# Altium integrated library GPDSE.IntLib: 634 symbols (part 1 of 7) (continued)
## UF4007 (continued)
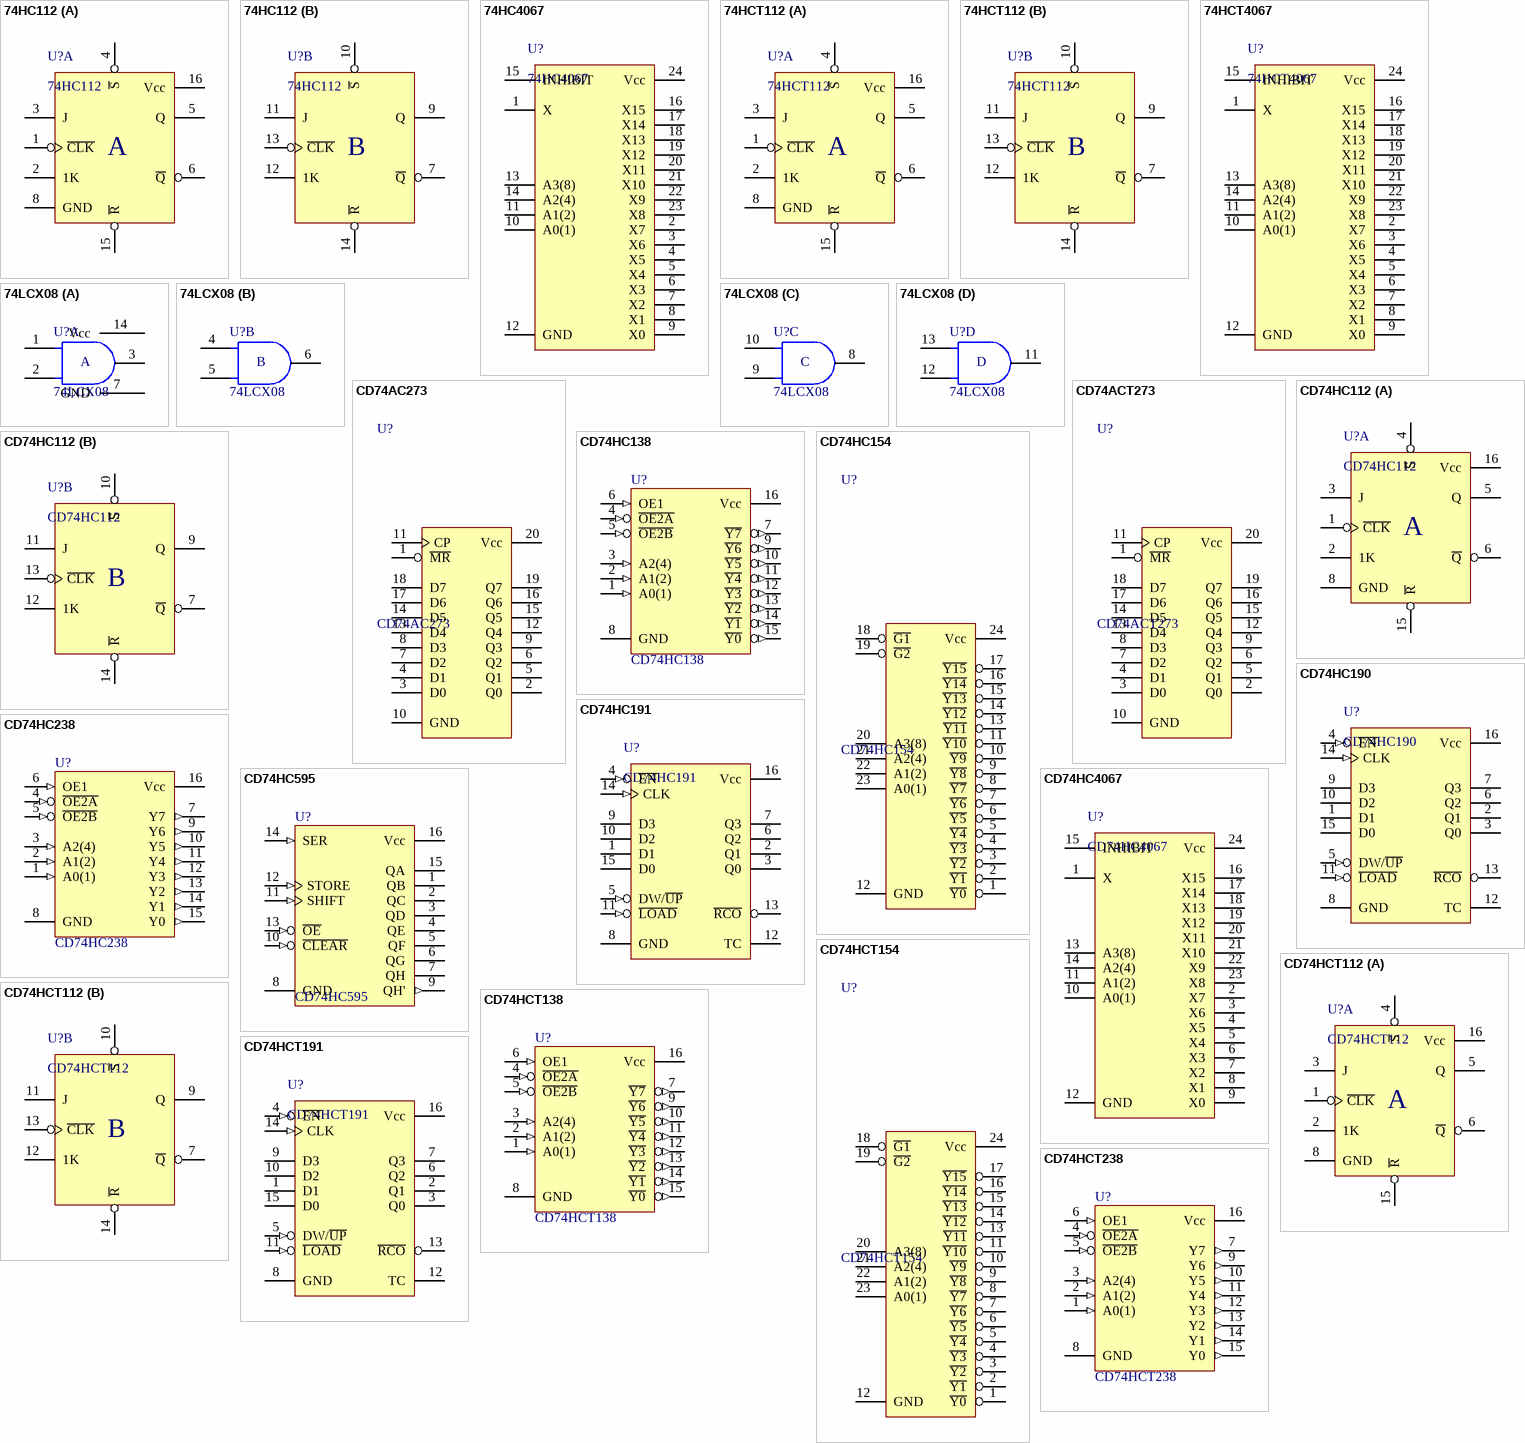
[diagram p2: symbols 74HC112 to CD74HCT238]

## 74HC112
designator U?
[NXP] Dual JK Negative Edge Triggered Flip-Flop with Set and Reset; Input Voltage (Vi): 0 to Vcc; Output High Current (Ioh): +25 mA; Output Low Current (Iol): -25 mA; Propagation Delay High-Low (tphl): 17ns; Supply Voltage (Vcc): 2.0 to 6.0 V; Output Voltage (Vo): 0 to Vcc; Propagation Delay Low-High (tplh): 17ns
footprint SOIC16-150(50) (SOIC 16 Leads; Row Spacing 3.81 mm; Pitch 1.27 mm; 3D André L´Hérault)
footprint SOP16-4.4mm(0.65mm) (Thin Shrink Small Outline Package 16 pin)
footprint SOP16-5.3mm(0.65mm) (Small Outline Package 16 pin)
part A pins: 1 ~{CLK}, 2 1K, 3 J, 4 ~{S}, 5 Q, 6 ~{Q}, 8 GND (power), 15 ~{R}, 16 Vcc (power)
part B pins: 7 ~{Q}, 9 Q, 10 ~{S}, 11 J, 12 1K, 13 ~{CLK}, 14 ~{R}
part A text: A
part B text: B

## 74HC4067
designator U?
[NXP] 16-Channel Analog Multiplexer / Demultiplexer
footprint SOIC24-300(50) (SOIC 24 Leads; Row Spacing 7.62 mm; Pitch 1.27 mm; 3D André L´Hérault)
footprint SOP24-5.3mm(0.65mm) (Footprint not found)
footprint SOP24-4.4mm(0.65mm) (Footprint not found)
pins: 1 X, 2 X7, 3 X6, 4 X5, 5 X4, 6 X3, 7 X2, 8 X1, 9 X0, 10 A0(1), 11 A1(2), 12 GND, 13 A3(8), 14 A2(4), 15 INHIBIT, 16 X15, 17 X14, 18 X13, 19 X12, 20 X11, 21 X10, 22 X9, 23 X8, 24 Vcc

## 74HCT112
designator U?
[NXP] Dual JK Negative Edge Triggered Flip-Flop with Set and Reset; Input Voltage (Vi): 0 to Vcc; Output High Current (Ioh): +25 mA; Output Low Current (Iol): -25 mA; Propagation Delay High-Low (tphl): 17ns; Supply Voltage (Vcc): 4.5 to 5.5 V; Output Voltage (Vo): 0 to Vcc; Propagation Delay Low-High (tplh): 17ns
footprint SOIC16-150(50) (SOIC 16 Leads; Row Spacing 3.81 mm; Pitch 1.27 mm; 3D André L´Hérault)
footprint SOP16-4.4mm(0.65mm) (Thin Shrink Small Outline Package 16 pin)
footprint SOP16-5.3mm(0.65mm) (Small Outline Package 16 pin)
part A pins: 1 ~{CLK}, 2 1K, 3 J, 4 ~{S}, 5 Q, 6 ~{Q}, 8 GND (power), 15 ~{R}, 16 Vcc (power)
part B pins: 7 ~{Q}, 9 Q, 10 ~{S}, 11 J, 12 1K, 13 ~{CLK}, 14 ~{R}
part A text: A
part B text: B

## 74HCT4067
designator U?
[NXP] 16-Channel Analog Multiplexer / Demultiplexer
footprint SOIC24-300(50) (SOIC 24 Leads; Row Spacing 7.62 mm; Pitch 1.27 mm; 3D André L´Hérault)
footprint SOP24-5.3mm(0.65mm) (Footprint not found)
footprint SOP24-4.4mm(0.65mm) (Footprint not found)
pins: 1 X, 2 X7, 3 X6, 4 X5, 5 X4, 6 X3, 7 X2, 8 X1, 9 X0, 10 A0(1), 11 A1(2), 12 GND, 13 A3(8), 14 A2(4), 15 INHIBIT, 16 X15, 17 X14, 18 X13, 19 X12, 20 X11, 21 X10, 22 X9, 23 X8, 24 Vcc

## 74LCX08
designator U?
[FAIR] Low Voltage Quad 2-Input AND Gate with 5V Tolerant Inputs; Supply Voltage (Vcc): 2.0 to 3.6 V; Input Voltage (Vi): 0 to 5.5 V; Output Voltage (Vo): 0 to Vcc; Output High Current (Ioh): -24 mA; Output Low Current (Iol): 24 mA; Propagation Delay High-Low (tphl): 5.5ns; Propagation Delay Low-High (tplh): 5.5ns
footprint SOIC14-150(50) (Plastic Small Outline 14 pinos)
footprint SOP14-5.3mm(1.27mm) (Small Outline Package 14 pin)
footprint SOP14-4.4mm(0.65mm) (Thin Shrink Small Outline Package 14 pin)
part A pins: 1 A0, 2 B0, 3 Y0, 7 GND, 14 Vcc
part B pins: 4 A1, 5 B1, 6 Y1
part C pins: 8 Y2, 9 B2, 10 A2
part D pins: 11 Y3, 12 B3, 13 A3
part A text: A
part B text: B
part C text: C
part D text: D

## CD74AC273
designator U?
[TI] Octal D Flip-Flop with Reset
footprint DIP20-300(100) (Footprint not found)
footprint SOIC20-300(50) (Plastic Small Outline 20 pinos largo)
pins: 1 ~{MR}, 2 Q0, 3 D0, 4 D1, 5 Q1, 6 Q2, 7 D2, 8 D3, 9 Q3, 10 GND, 11 CP, 12 Q4, 13 D4, 14 D5, 15 Q5, 16 Q6, 17 D6, 18 D7, 19 Q7, 20 Vcc

## CD74ACT273
designator U?
[TI] Octal D Flip-Flop with Reset
footprint DIP20-300(100) (Footprint not found)
footprint SOIC20-300(50) (Plastic Small Outline 20 pinos largo)
footprint SOP20-4.4mm(0.65mm) (Footprint not found)
footprint SOP20-5.3mm(0.65mm) (Footprint not found)
pins: 1 ~{MR}, 2 Q0, 3 D0, 4 D1, 5 Q1, 6 Q2, 7 D2, 8 D3, 9 Q3, 10 GND, 11 CP, 12 Q4, 13 D4, 14 D5, 15 Q5, 16 Q6, 17 D6, 18 D7, 19 Q7, 20 Vcc

## CD74HC112
designator U?
[TI] Dual JK Negative Edge Triggered Flip-Flop with Set and Reset; Input Voltage (Vi): 0 to Vcc; Output High Current (Ioh): +25 mA; Output Low Current (Iol): -25 mA; Propagation Delay High-Low (tphl): 17ns; Supply Voltage (Vcc): 2.0 to 6.0 V; Output Voltage (Vo): 0 to Vcc; Propagation Delay Low-High (tplh): 17ns
footprint SOIC16-150(50) (SOIC 16 Leads; Row Spacing 3.81 mm; Pitch 1.27 mm; 3D André L´Hérault)
footprint SOP16-4.4mm(0.65mm) (Thin Shrink Small Outline Package 16 pin)
footprint SOP16-5.3mm(1.27mm) (Small Outline Package 16 pin)
footprint DIP16-300(100) (DIP, 16-Leads, Row Spacing 7.62mm, Pitch 2.54mm, Body 22.86x6.35mm)
part A pins: 1 ~{CLK}, 2 1K, 3 J, 4 ~{S}, 5 Q, 6 ~{Q}, 8 GND (power), 15 ~{R}, 16 Vcc (power)
part B pins: 7 ~{Q}, 9 Q, 10 ~{S}, 11 J, 12 1K, 13 ~{CLK}, 14 ~{R}
part A text: A
part B text: B

## CD74HC138
designator U?
[TI] High Speed CMOS Logic 3-Line to 8-Line Decoder / Demultiplexer Inverting; Supply Voltage (Vcc): 2.0 to 6.0 V; Input Voltage (Vi): 0 to Vcc; Propagation Delay High-Low (tphl): 13ns; Output High Current (Ioh): -25 mA; Output Low Current (Iol): 25 mA; Output Voltage (Vo): 0 to Vcc; Propagation Delay Low-High (tplh): 13ns
footprint SOIC16-150(50) (SOIC; 16 Leads; Row Spacing 3.81 mm; Pitch 1.27 mm; 3D Antonio Fagaldo)
footprint DIP16-300(100) (DIP, 16-Leads, Row Spacing 7.62mm, Pitch 2.54mm, Body 22.86x6.35mm)
pins: 1 A0(1) (in), 2 A1(2) (in), 3 A2(4) (in), 4 ~{OE2A} (in), 5 ~{OE2B} (in), 6 OE1 (in), 7 ~{Y7} (out), 8 GND (power), 9 ~{Y6} (out), 10 ~{Y5} (out), 11 ~{Y4} (out), 12 ~{Y3} (out), 13 ~{Y2} (out), 14 ~{Y1} (out), 15 ~{Y0} (out), 16 Vcc (power)

## CD74HC154
designator U?
[TI] 4-Line to 16-Line Decoder / Demultiplexer
footprint SOIC24-300(50) (Plastic Small Outline 24 pinos largo)
pins: 1 ~{Y0}, 2 ~{Y1}, 3 ~{Y2}, 4 ~{Y3}, 5 ~{Y4}, 6 ~{Y5}, 7 ~{Y6}, 8 ~{Y7}, 9 ~{Y8}, 10 ~{Y9}, 11 ~{Y10}, 12 GND, 13 ~{Y11}, 14 ~{Y12}, 15 ~{Y13}, 16 ~{Y14}, 17 ~{Y15}, 18 ~{G1}, 19 ~{G2}, 20 A3(8), 21 A2(4), 22 A1(2), 23 A0(1), 24 Vcc

## CD74HC190
designator U?
[TI] Synchronous Up/Down BCD Decade Counter with Down/Up Mode Control
footprint DIP16-300(100) (DIP, 16-Leads, Row Spacing 7.62mm, Pitch 2.54mm, Body 22.86x6.35mm)
footprint SOP16-5.3mm(1.27mm) (Small Outline Package 16 pin)
footprint SOP16-4.4mm(0.65mm) (Thin Shrink Small Outline Package 16 pin)
pins: 1 D1, 2 Q1, 3 Q0, 4 ~{EN} (in), 5 DW/~{UP} (in), 6 Q2, 7 Q3, 8 GND, 9 D3, 10 D2, 11 ~{LOAD} (in), 12 TC, 13 ~{RCO}, 14 CLK (in), 15 D0, 16 Vcc

## CD74HC191
designator U?
[TI] Synchronous Up/Down 4-Bits Counter with Down/Up Mode Control
footprint DIP16-300(100) (DIP; 16 Leads; Row Spacing 7.62 mm; Pitch 2.54 mm; 3D CircuitWorks)
footprint SOIC16-150(50) (SOIC 16 Leads; Row Spacing 3.81 mm; Pitch 1.27 mm; 3D André L´Hérault)
pins: 1 D1, 2 Q1, 3 Q0, 4 ~{EN} (in), 5 DW/~{UP} (in), 6 Q2, 7 Q3, 8 GND, 9 D3, 10 D2, 11 ~{LOAD} (in), 12 TC, 13 ~{RCO}, 14 CLK (in), 15 D0, 16 Vcc

## CD74HC238
designator U?
[TI] High Speed CMOS Logic 3-Line to 8-Line Decoder / Demultiplexer Noninverting; Supply Voltage (Vcc): 2.0 to 6.0 V; Input Voltage (Vi): 0 to Vcc; Propagation Delay High-Low (tphl): 13ns; Output High Current (Ioh): -25 mA; Output Low Current (Iol): 25 mA; Output Voltage (Vo): 0 to Vcc; Propagation Delay Low-High (tplh): 13ns
footprint SOIC16-150(50) (SOIC; 16 Leads; Row Spacing 3.81 mm; Pitch 1.27 mm; 3D Antonio Fagaldo)
footprint DIP16-300(100) (DIP; 16 Leads; Row Spacing 7.62 mm; Pitch 2.54 mm; 3D CircuitWorks)
footprint SOP16-4.4mm(0.65mm) (Footprint not found)
footprint SOP16-5.3mm(1.27mm) (Small Outline Package 16 pin)
pins: 1 A0(1) (in), 2 A1(2) (in), 3 A2(4) (in), 4 ~{OE2A} (in), 5 ~{OE2B} (in), 6 OE1 (in), 7 Y7 (out), 8 GND (power), 9 Y6 (out), 10 Y5 (out), 11 Y4 (out), 12 Y3 (out), 13 Y2 (out), 14 Y1 (out), 15 Y0 (out), 16 Vcc (power)

## CD74HC595
designator U?
[TI] 8-Bit Shift Register with 3-State Output Registers; Supply Voltage (Vcc): 2.0 to 6.0 V; Input Voltage (Vi): 0 to Vcc; Output High Current (Ioh): -6 mA; Output Low Current (Iol): 6 mA; Clock Frequency (fclock): 31 MHz; Output Voltage (Vo): 0 to Vcc
footprint SOIC16-150(50) (SOIC; 16 Leads; Row Spacing 3.81 mm; Pitch 1.27 mm; 3D Antonio Fagaldo)
footprint DIP16-300(100) (DIP, 16-Leads, Row Spacing 7.62mm, Pitch 2.54mm, Body 22.86x6.35mm)
footprint SOP16-5.3mm(0.65mm) (Footprint not found)
footprint SOIC16-300(50) (Footprint not found)
footprint SOP16-5.3mm(1.27mm) (Footprint not found)
pins: 1 QB (hiz), 2 QC (hiz), 3 QD (hiz), 4 QE (hiz), 5 QF (hiz), 6 QG (hiz), 7 QH (hiz), 8 GND (power), 9 QH' (out), 10 ~{CLEAR} (in), 11 SHIFT (in), 12 STORE (in), 13 ~{OE} (in), 14 SER (in), 15 QA (hiz), 16 Vcc (power)

## CD74HC4067
designator U?
[TI] 16-Channel Analog Multiplexer / Demultiplexer
footprint SOIC24-300(50) (SOIC 24 Leads; Row Spacing 7.62 mm; Pitch 1.27 mm; 3D André L´Hérault)
footprint SOP24-5.3mm(0.65mm) (Footprint not found)
pins: 1 X, 2 X7, 3 X6, 4 X5, 5 X4, 6 X3, 7 X2, 8 X1, 9 X0, 10 A0(1), 11 A1(2), 12 GND, 13 A3(8), 14 A2(4), 15 INHIBIT, 16 X15, 17 X14, 18 X13, 19 X12, 20 X11, 21 X10, 22 X9, 23 X8, 24 Vcc

## CD74HCT112
designator U?
[TI] Dual JK Negative Edge Triggered Flip-Flop with Set and Reset; Input Voltage (Vi): 0 to Vcc; Output High Current (Ioh): +25 mA; Output Low Current (Iol): -25 mA; Propagation Delay High-Low (tphl): 17ns; Supply Voltage (Vcc): 4.5 to 5.5 V; Output Voltage (Vo): 0 to Vcc; Propagation Delay Low-High (tplh): 17ns
footprint DIP16-300(100) (DIP, 16-Leads, Row Spacing 7.62mm, Pitch 2.54mm, Body 22.86x6.35mm)
part A pins: 1 ~{CLK}, 2 1K, 3 J, 4 ~{S}, 5 Q, 6 ~{Q}, 8 GND (power), 15 ~{R}, 16 Vcc (power)
part B pins: 7 ~{Q}, 9 Q, 10 ~{S}, 11 J, 12 1K, 13 ~{CLK}, 14 ~{R}
part A text: A
part B text: B

## CD74HCT138
designator U?
[TI] High Speed CMOS Logic 3-Line to 8-Line Decoder / Demultiplexer Inverting; Supply Voltage (Vcc): 4.5 to 5.5 V; Input Voltage (Vi): 0 to Vcc; Propagation Delay High-Low (tphl): 14ns; Output High Current (Ioh): -25 mA; Output Low Current (Iol): 25 mA; Output Voltage (Vo): 0 to Vcc; Propagation Delay Low-High (tplh): 14ns
footprint SOIC16-150(50) (SOIC; 16 Leads; Row Spacing 3.81 mm; Pitch 1.27 mm; 3D Antonio Fagaldo)
footprint DIP16-300(100) (DIP; 16 Leads; Row Spacing 7.62 mm; Pitch 2.54 mm; 3D CircuitWorks)
pins: 1 A0(1) (in), 2 A1(2) (in), 3 A2(4) (in), 4 ~{OE2A} (in), 5 ~{OE2B} (in), 6 OE1 (in), 7 ~{Y7} (out), 8 GND (power), 9 ~{Y6} (out), 10 ~{Y5} (out), 11 ~{Y4} (out), 12 ~{Y3} (out), 13 ~{Y2} (out), 14 ~{Y1} (out), 15 ~{Y0} (out), 16 Vcc (power)

## CD74HCT154
designator U?
[TI] 4-Line to 16-Line Decoder / Demultiplexer
footprint SOIC24-300(50) (Plastic Small Outline 24 pinos largo)
pins: 1 ~{Y0}, 2 ~{Y1}, 3 ~{Y2}, 4 ~{Y3}, 5 ~{Y4}, 6 ~{Y5}, 7 ~{Y6}, 8 ~{Y7}, 9 ~{Y8}, 10 ~{Y9}, 11 ~{Y10}, 12 GND, 13 ~{Y11}, 14 ~{Y12}, 15 ~{Y13}, 16 ~{Y14}, 17 ~{Y15}, 18 ~{G1}, 19 ~{G2}, 20 A3(8), 21 A2(4), 22 A1(2), 23 A0(1), 24 Vcc

## CD74HCT191
designator U?
[TI] Synchronous Up/Down 4-Bits Counter with Down/Up Mode Control
footprint DIP16-300(100) (DIP; 16 Leads; Row Spacing 7.62 mm; Pitch 2.54 mm; 3D CircuitWorks)
footprint SOIC16-150(50) (SOIC 16 Leads; Row Spacing 3.81 mm; Pitch 1.27 mm; 3D André L´Hérault)
pins: 1 D1, 2 Q1, 3 Q0, 4 ~{EN} (in), 5 DW/~{UP} (in), 6 Q2, 7 Q3, 8 GND, 9 D3, 10 D2, 11 ~{LOAD} (in), 12 TC, 13 ~{RCO}, 14 CLK (in), 15 D0, 16 Vcc

## CD74HCT238
designator U?
[TI] High Speed CMOS Logic 3-Line to 8-Line Decoder / Demultiplexer Noninverting; Supply Voltage (Vcc): 4.5 to 5.5 V; Input Voltage (Vi): 0 to Vcc; Propagation Delay High-Low (tphl): 14ns; Output High Current (Ioh): -25 mA; Output Low Current (Iol): 25 mA; Output Voltage (Vo): 0 to Vcc; Propagation Delay Low-High (tplh): 14ns
footprint SOIC16-150(50) (SOIC; 16 Leads; Row Spacing 3.81 mm; Pitch 1.27 mm; 3D Antonio Fagaldo)
footprint DIP16-300(100) (DIP; 16 Leads; Row Spacing 7.62 mm; Pitch 2.54 mm; 3D CircuitWorks)
pins: 1 A0(1) (in), 2 A1(2) (in), 3 A2(4) (in), 4 ~{OE2A} (in), 5 ~{OE2B} (in), 6 OE1 (in), 7 Y7 (out), 8 GND (power), 9 Y6 (out), 10 Y5 (out), 11 Y4 (out), 12 Y3 (out), 13 Y2 (out), 14 Y1 (out), 15 Y0 (out), 16 Vcc (power)

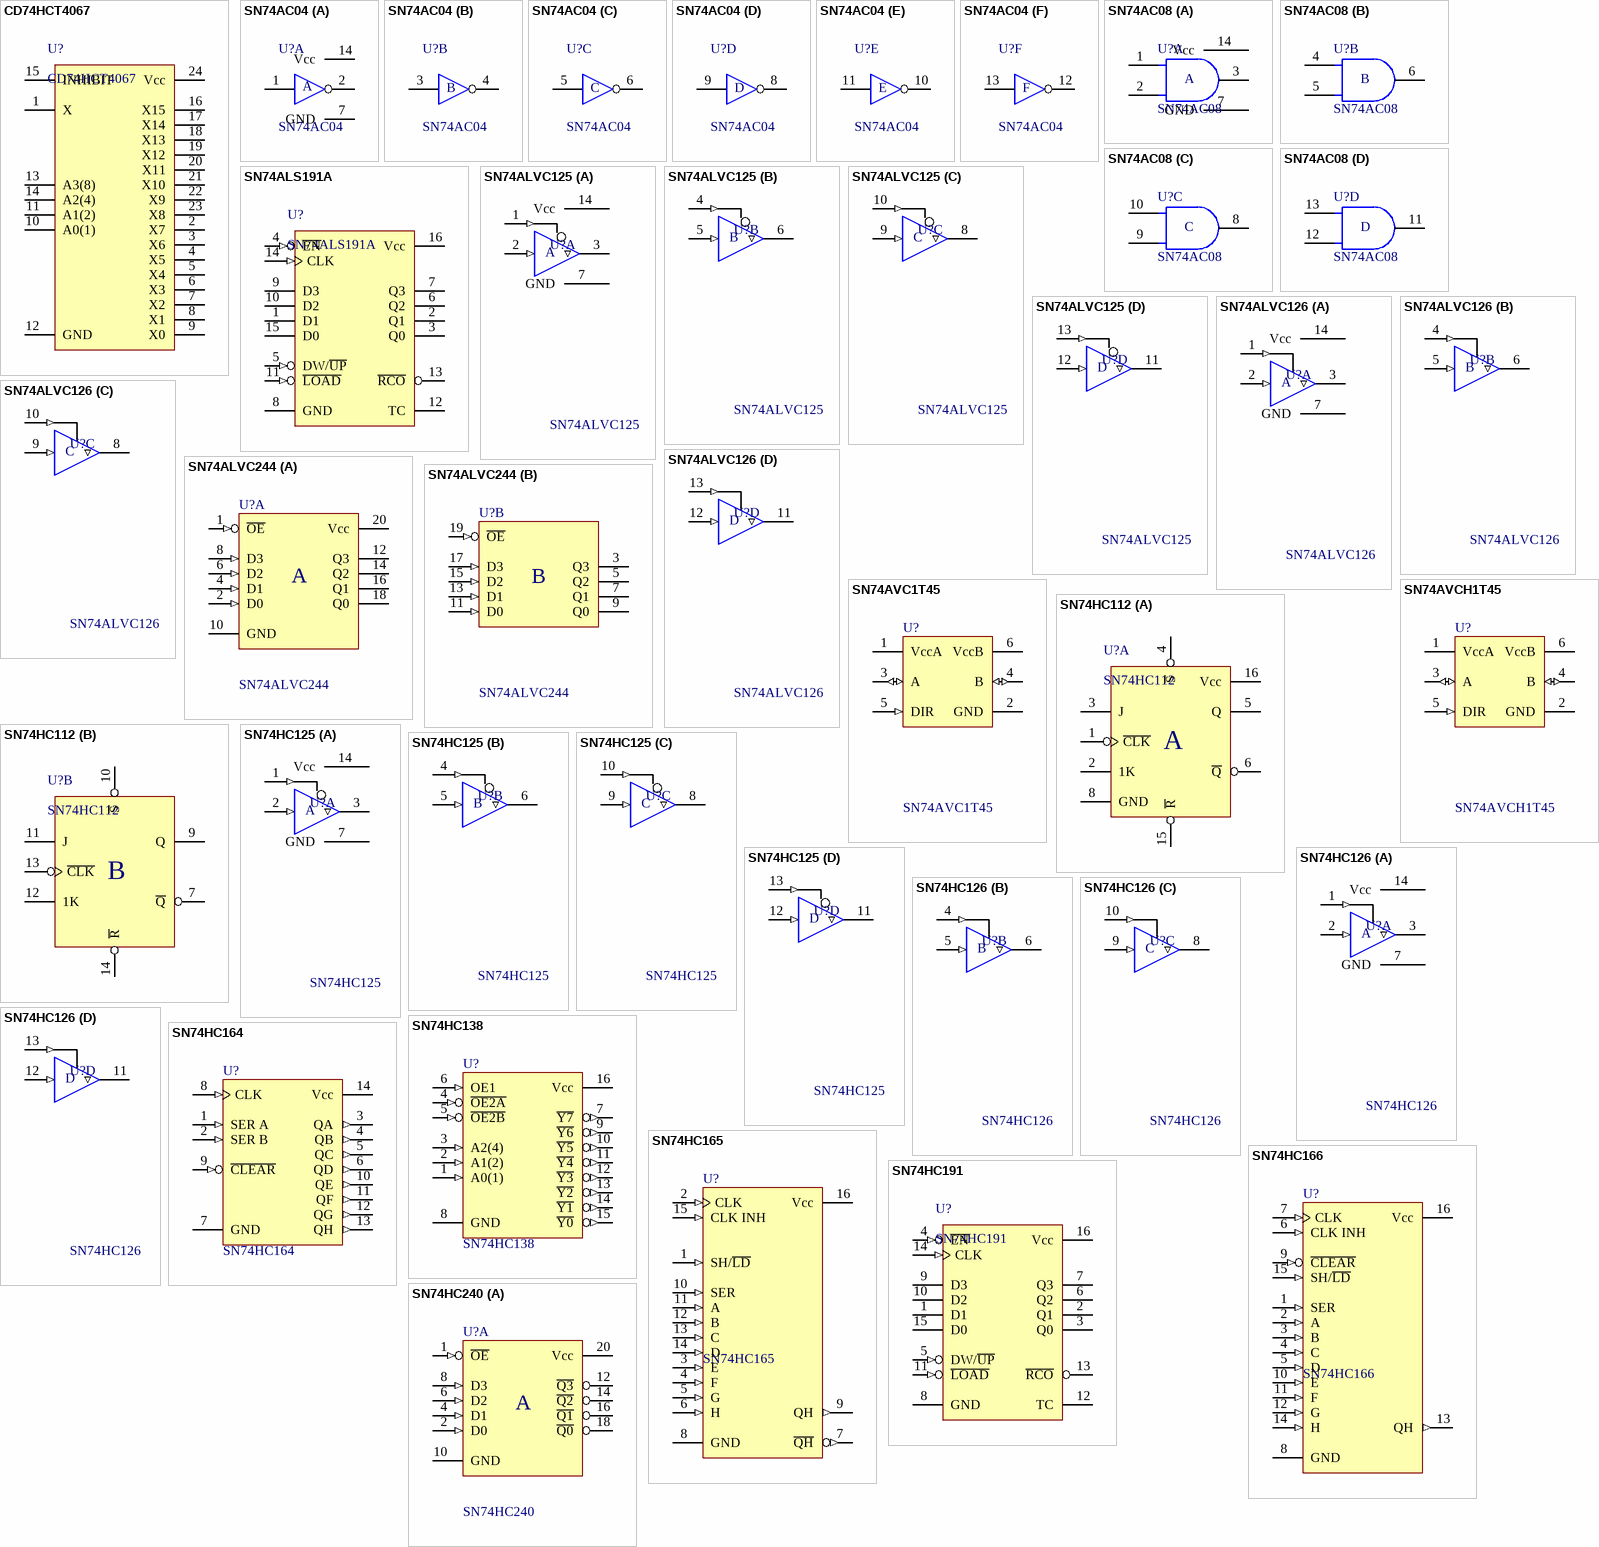
[diagram p3: symbols CD74HCT4067 to SN74HC240]

## CD74HCT4067
designator U?
[TI] 16-Channel Analog Multiplexer / Demultiplexer
footprint SOIC24-300(50) (SOIC 24 Leads; Row Spacing 7.62 mm; Pitch 1.27 mm; 3D André L´Hérault)
pins: 1 X, 2 X7, 3 X6, 4 X5, 5 X4, 6 X3, 7 X2, 8 X1, 9 X0, 10 A0(1), 11 A1(2), 12 GND, 13 A3(8), 14 A2(4), 15 INHIBIT, 16 X15, 17 X14, 18 X13, 19 X12, 20 X11, 21 X10, 22 X9, 23 X8, 24 Vcc

## SN74AC04
designator U?
[TI] Hex Logic Inverter; Input Voltage (Vi): 0 to Vcc; Output High Current (Ioh): -24 mA; Output Low Current (Iol): 24 mA; Propagation Delay High-Low (tphl): 9.5ns; Propagation Delay Low-High (tplh): 10ns; Supply Voltage (Vcc): 2.0 to 6.0 V; Output Voltage (Vo): 0 to Vcc
footprint DIP14-300(100) (DIP, 14-Leads, Row Spacing 7.62mm, Pitch 2.54mm)
footprint SOIC14-150(50) (Plastic Small Outline 14 pinos)
footprint SOP14-5.3mm(1.27mm) (Small Outline Package 14 pin)
footprint SOP14-5.3mm(0.65mm) (Small Outline Package 14 pin)
footprint SOP14-4.4mm(0.65mm) (Thin Shrink Small Outline Package 14 pin)
part A pins: 1 2A, 2 2Y, 7 GND (power), 14 Vcc (power)
part B pins: 3 2A, 4 2Y
part C pins: 5 3A, 6 3Y
part D pins: 8 4Y, 9 4A
part E pins: 10 5Y, 11 5A
part F pins: 12 6Y, 13 6A
part A text: A
part B text: B
part C text: C
part D text: D
part E text: E
part F text: F

## SN74AC08
designator U?
[TI] Quad 2-Input AND Gate; Supply Voltage (Vcc): 2.0 to 6.0 V; Input Voltage (Vi): 0 to Vcc; Output High Current (Ioh): -24 mA; Output Low Current (Iol): 24 mA; Propagation Delay High-Low (tphl): 9ns; Propagation Delay Low-High (tplh): 10ns; Output Voltage (Vo): 0 to Vcc
footprint DIP14-300(100) (DIP, 14-Leads, Row Spacing 7.62mm, Pitch 2.54mm)
footprint SOIC14-150(50) (SOIC 14 Leads; Row Spacing 3.81 mm; Pitch 1.27 mm; 3D André L´Hérault)
footprint SOP14-4.4mm(0.65mm) (Thin Shrink Small Outline Package 14 pin)
footprint SOP14-5.3mm(1.27mm) (Small Outline Package 14 pin)
footprint SOP14-5.3mm(0.65mm) (Small Outline Package 14 pin)
part A pins: 1 A0, 2 B0, 3 Y0, 7 GND, 14 Vcc
part B pins: 4 A1, 5 B1, 6 Y1
part C pins: 8 Y2, 9 B2, 10 A2
part D pins: 11 Y3, 12 B3, 13 A3
part A text: A
part B text: B
part C text: C
part D text: D

## SN74ALS191A
designator U?
[TI] Synchronous Up/Down 4-Bits Counter with Down/Up Mode Control
footprint DIP16-300(100) (DIP; 16 Leads; Row Spacing 7.62 mm; Pitch 2.54 mm; 3D CircuitWorks)
footprint SOIC16-150(50) (SOIC 16 Leads; Row Spacing 3.81 mm; Pitch 1.27 mm; 3D André L´Hérault)
pins: 1 D1, 2 Q1, 3 Q0, 4 ~{EN} (in), 5 DW/~{UP} (in), 6 Q2, 7 Q3, 8 GND, 9 D3, 10 D2, 11 ~{LOAD} (in), 12 TC, 13 ~{RCO}, 14 CLK (in), 15 D0, 16 Vcc

## SN74ALVC125
designator U?
[TI] Quadruple Bus Buffer Gates with 3-State Outputs; Supply Voltage (Vcc): 1.65 to 3.6 V; Input Voltage (Vi): 0 to 4.6 V; Output Voltage (Vo): 0 to Vcc; Output High Current (Ioh): -24 mA; Output Low Current (Iol): 24 mA; Propagation Delay (tpd): 2.8ns
footprint SOIC14-150(50) (SOIC 14 Leads; Row Spacing 3.81 mm; Pitch 1.27 mm; 3D André L´Hérault)
footprint SOP14-5.3mm(1.27mm) (Small Outline Package 14 pin)
footprint SOP14-4.4mm(0.65mm) (Thin Shrink Small Outline Package 14 pin)
footprint SOP14-4.4mm(0.4mm) (Footprint not found)
part A pins: 1 OE1 (in), 2 A1 (in), 3 Y1 (hiz), 7 GND, 14 Vcc
part B pins: 4 OE2 (in), 5 A2 (in), 6 Y2 (hiz)
part C pins: 8 Y3 (hiz), 9 A3 (in), 10 OE3 (in)
part D pins: 11 Y4 (hiz), 12 A4 (in), 13 OE4 (in)
part A text: A
part B text: B
part C text: C
part D text: D

## SN74ALVC126
designator U?
[TI] Quadruple Bus Buffer Gates with 3-State Outputs; Supply Voltage (Vcc): 1.65 to 3.6 V; Input Voltage (Vi): 0 to 4.6 V; Output Voltage (Vo): 0 to Vcc; Output High Current (Ioh): -24 mA; Output Low Current (Iol): 24 mA; Propagation Delay (tpd): 3.1ns
footprint SOIC14-150(50) (SOIC 14 Leads; Row Spacing 3.81 mm; Pitch 1.27 mm; 3D André L´Hérault)
footprint SOP14-5.3mm(1.27mm) (Small Outline Package 14 pin)
footprint SOP14-4.4mm(0.65mm) (Thin Shrink Small Outline Package 14 pin)
footprint SOP14-4.4mm(0.4mm) (Footprint not found)
part A pins: 1 OE1 (in), 2 A1 (in), 3 Y1 (hiz), 7 GND, 14 Vcc
part B pins: 4 OE2 (in), 5 A2 (in), 6 Y2 (hiz)
part C pins: 8 Y3 (hiz), 9 A3 (in), 10 OE3 (in)
part D pins: 11 Y4 (hiz), 12 A4 (in), 13 OE4 (in)
part A text: A
part B text: B
part C text: C
part D text: D

## SN74ALVC244
designator U?
[TI] Octal Buffer/Driver with 3-State Outputs; Supply Voltage (Vcc): 1.65 to 3.6 V; Input Voltage (Vi): 0 to 4.6 V; Output Voltage (Vo): 0 to Vcc; Output High Current (Ioh): -24 mA; Output Low Current (Iol): 24 mA; Propagation Delay (tpd): 2.8ns
footprint SOIC20-300(50) (SOIC 20 Leads; Row Spacing 7.62 mm; Pitch 1.27 mm; 3D André L´Hérault)
footprint SOP20-5.3mm(1.27mm) (Footprint not found)
footprint SOP20-4.4mm(0.65mm) (Footprint not found)
footprint SOP20-4.4mm(0.4mm) (Footprint not found)
part A pins: 1 ~{OE} (in), 2 D0 (in), 4 D1 (in), 6 D2 (in), 8 D3 (in), 10 GND (power), 12 Q3 (hiz), 14 Q2 (hiz), 16 Q1 (hiz), 18 Q0 (hiz), 20 Vcc (power)
part B pins: 3 Q3 (hiz), 5 Q2 (hiz), 7 Q1 (hiz), 9 Q0 (hiz), 11 D0 (in), 13 D1 (in), 15 D2 (in), 17 D3 (in), 19 ~{OE} (in)
part A text: A
part B text: B

## SN74AVC1T45
designator U?
[TI] Single-Bit Dual-Supply Bus Transceiver with Configurable Voltage Translation and 3-State Outputs; Supply Voltage (Vcc): 1.2 to 3.6 V; Input Voltage (Vi): 0 to 4.6 V; Output Voltage (Vo): 0 to Vcc; Output High Current (Ioh): -12 mA; Output Low Current (Iol): 12 mA; Max Data Rate: 500 Mbps
footprint SOT-23/6 (Small Outline Transistor 6 leads)
pins: 1 VccA (power), 2 GND (power), 3 A (io), 4 B (io), 5 DIR (in), 6 VccB (power)

## SN74AVCH1T45
designator U?
[TI] Single-Bit Dual-Supply Bus Transceiver with Configurable Voltage Translation and 3-State Outputs; Supply Voltage (Vcc): 1.2 to 3.6 V; Input Voltage (Vi): 0 to 4.6 V; Output Voltage (Vo): 0 to Vcc; Output High Current (Ioh): -12 mA; Output Low Current (Iol): 12 mA; Max Data Rate: 380 Mbps
footprint SOT-23/6 (Small Outline Transistor 6 leads)
pins: 1 VccA (power), 2 GND (power), 3 A (io), 4 B (io), 5 DIR (in), 6 VccB (power)

## SN74HC112
designator U?
[TI] Dual JK Negative Edge Triggered Flip-Flop with Set and Reset; Input Voltage (Vi): 0 to Vcc; Output High Current (Ioh): +25 mA; Output Low Current (Iol): -25 mA; Propagation Delay High-Low (tphl): 17ns; Supply Voltage (Vcc): 2.0 to 6.0 V; Output Voltage (Vo): 0 to Vcc; Propagation Delay Low-High (tplh): 17ns
footprint SOIC16-150(50) (SOIC 16 Leads; Row Spacing 3.81 mm; Pitch 1.27 mm; 3D André L´Hérault)
footprint DIP16-300(100) (DIP, 16-Leads, Row Spacing 7.62mm, Pitch 2.54mm, Body 22.86x6.35mm)
part A pins: 1 ~{CLK}, 2 1K, 3 J, 4 ~{S}, 5 Q, 6 ~{Q}, 8 GND (power), 15 ~{R}, 16 Vcc (power)
part B pins: 7 ~{Q}, 9 Q, 10 ~{S}, 11 J, 12 1K, 13 ~{CLK}, 14 ~{R}
part A text: A
part B text: B

## SN74HC125
designator U?
[TI] Quadruple Bus Buffer Gates with 3-State Outputs; Supply Voltage (Vcc): 2.0 to 6.0 V; Input Voltage (Vi): 0 to Vcc; Output High Current (Ioh): -6 mA; Output Low Current (Iol): 6 mA; Propagation Delay (tpd): 11ns; Output Voltage (Vo): 0 to Vcc
footprint DIP14-300(100) (DIP, 14-Leads, Row Spacing 7.62mm, Pitch 2.54mm)
footprint SOIC14-150(50) (SOIC 14 Leads; Row Spacing 3.81 mm; Pitch 1.27 mm; 3D André L´Hérault)
footprint SOP14-5.3mm(1.27mm) (Small Outline Package 14 pin)
footprint SOP14-4.4mm(0.65mm) (Thin Shrink Small Outline Package 14 pin)
footprint SOP14-5.3mm(0.65mm) (Small Outline Package 14 pin)
part A pins: 1 ~{OE1} (in), 2 A1 (in), 3 Y1 (hiz), 7 GND, 14 Vcc
part B pins: 4 ~{OE2} (in), 5 A2 (in), 6 Y2 (hiz)
part C pins: 8 Y3 (hiz), 9 A3 (in), 10 ~{OE3} (in)
part D pins: 11 Y4 (hiz), 12 A4 (in), 13 ~{OE4} (in)
part A text: A
part B text: B
part C text: C
part D text: D

## SN74HC126
designator U?
[TI] Quadruple Bus Buffer Gates with 3-State Outputs; Supply Voltage (Vcc): 2.0 to 6.0 V; Input Voltage (Vi): 0 to Vcc; Output High Current (Ioh): -6 mA; Output Low Current (Iol): 6 mA; Propagation Delay (tpd): 11ns; Output Voltage (Vo): 0 to Vcc
footprint DIP14-300(100) (DIP, 14-Leads, Row Spacing 7.62mm, Pitch 2.54mm)
footprint SOIC14-150(50) (SOIC 14 Leads; Row Spacing 3.81 mm; Pitch 1.27 mm; 3D André L´Hérault)
footprint SOP14-5.3mm(0.65mm) (Small Outline Package 14 pin)
footprint SOP14-5.3mm(1.27mm) (Small Outline Package 14 pin)
footprint SOP14-4.4mm(0.65mm) (Thin Shrink Small Outline Package 14 pin)
part A pins: 1 OE1 (in), 2 A1 (in), 3 Y1 (hiz), 7 GND, 14 Vcc
part B pins: 4 OE2 (in), 5 A2 (in), 6 Y2 (hiz)
part C pins: 8 Y3 (hiz), 9 A3 (in), 10 OE3 (in)
part D pins: 11 Y4 (hiz), 12 A4 (in), 13 OE4 (in)
part A text: A
part B text: B
part C text: C
part D text: D

## SN74HC138
designator U?
[TI] 3-Line to 8-Line Decoder / Demultiplexer; Output Voltage (Vo): 0 to Vcc; Supply Voltage (Vcc): 2.0 to 6.0 V; Propagation Delay High-Low (tphl): 38ns; Output High Current (Ioh): -25 mA; Output Low Current (Iol): 25 mA; Input Voltage (Vi): 0 to Vcc; Propagation Delay Low-High (tplh): 38ns
footprint SOIC16-150(50) (Plastic Small Outline 16 pinos)
footprint DIP16-300(100) (DIP, 16-Leads, Row Spacing 7.62mm, Pitch 2.54mm, Body 22.86x6.35mm)
footprint SOP16-4.4mm(0.65mm) (Footprint not found)
footprint SOP16-5.3mm(0.65mm) (Footprint not found)
footprint SOP16-5.3mm(1.27mm) (Small Outline Package 16 pin)
pins: 1 A0(1) (in), 2 A1(2) (in), 3 A2(4) (in), 4 ~{OE2A} (in), 5 ~{OE2B} (in), 6 OE1 (in), 7 ~{Y7} (out), 8 GND (power), 9 ~{Y6} (out), 10 ~{Y5} (out), 11 ~{Y4} (out), 12 ~{Y3} (out), 13 ~{Y2} (out), 14 ~{Y1} (out), 15 ~{Y0} (out), 16 Vcc (power)

## SN74HC164
designator U?
[TI] 8-bit Parallel-Out Serial Shift Registers; Supply Voltage (Vcc): 2.0 to 6.0 V; Input Voltage (Vi): 0 to Vcc; Output High Current (Ioh): -4 mA; Output Low Current (Iol): 4 mA; Clock Frequency (fclock): 25 MHz; Output Voltage (Vo): 0 to Vcc
footprint DIP14-300(100) (DIP, 14-Leads, Row Spacing 7.62mm, Pitch 2.54mm)
footprint SOIC14-150(50) (SOIC 14 Leads; Row Spacing 3.81 mm; Pitch 1.27 mm; 3D André L´Hérault)
footprint SOP14-5.3mm(1.27mm) (Small Outline Package 14 pin)
footprint SOP14-4.4mm(0.65mm) (Thin Shrink Small Outline Package 14 pin)
pins: 1 SER A (in), 2 SER B (in), 3 QA (out), 4 QB (out), 5 QC (out), 6 QD (out), 7 GND (power), 8 CLK (in), 9 ~{CLEAR} (in), 10 QE (out), 11 QF (out), 12 QG (out), 13 QH (out), 14 Vcc (power)

## SN74HC165
designator U?
[TI] Parallel-Load 8-bit Shift Registers; Supply Voltage (Vcc): 2.0 to 6.0 V; Input Voltage (Vi): 0 to Vcc; Output High Current (Ioh): -4 mA; Output Low Current (Iol): 4 mA; Clock Frequency (fclock): 25 MHz; Output Voltage (Vo): 0 to Vcc
footprint DIP16-300(100) (DIP, 16-Leads, Row Spacing 7.62mm, Pitch 2.54mm, Body 22.86x6.35mm)
footprint SOIC16-150(50) (SOIC 16 Leads; Row Spacing 3.81 mm; Pitch 1.27 mm; 3D André L´Hérault)
footprint SOP16-4.4mm(0.65mm) (Thin Shrink Small Outline Package 16 pin)
footprint SOP16-5.3mm(0.65mm) (Small Outline Package 16 pin)
footprint SOP16-5.3mm(1.27mm) (Small Outline Package 16 pin)
pins: 1 SH/~{LD} (in), 2 CLK (in), 3 E (in), 4 F (in), 5 G (in), 6 H (in), 7 ~{QH} (out), 8 GND (power), 9 QH (out), 10 SER (in), 11 A (in), 12 B (in), 13 C (in), 14 D (in), 15 CLK INH (in), 16 Vcc (power)

## SN74HC166
designator U?
[TI] Parallel-Load 8-bit Shift Registers; Supply Voltage (Vcc): 2.0 to 6.0 V; Input Voltage (Vi): 0 to Vcc; Output High Current (Ioh): -4 mA; Output Low Current (Iol): 4 mA; Clock Frequency (fclock): 25 MHz; Output Voltage (Vo): 0 to Vcc
footprint DIP16-300(100) (DIP, 16-Leads, Row Spacing 7.62mm, Pitch 2.54mm, Body 22.86x6.35mm)
footprint SOIC16-150(50) (SOIC 16 Leads; Row Spacing 3.81 mm; Pitch 1.27 mm; 3D André L´Hérault)
footprint SOP16-4.4mm(0.65mm) (Thin Shrink Small Outline Package 16 pin)
footprint SOP16-5.3mm(0.65mm) (Small Outline Package 16 pin)
footprint SOP16-5.3mm(1.27mm) (Small Outline Package 16 pin)
pins: 1 SER (in), 2 A (in), 3 B (in), 4 C (in), 5 D (in), 6 CLK INH (in), 7 CLK (in), 8 GND (power), 9 ~{CLEAR} (in), 10 E (in), 11 F (in), 12 G (in), 13 QH (out), 14 H (in), 15 SH/~{LD} (in), 16 Vcc (power)